# Altium footprint library Vowstar_Basic_Device.PcbLib: 170 footprints (part 5 of 11)
Each footprint in its own frame and in the unit in brackets; x right, y up, seen from the top. Pads: shape width x height; smd on the part's side, far side on the other; paste and mask are expansions set on the pad; w line width, h text height; cw(c..) or ccw(c..) is an arc to the next point about the centre after c.
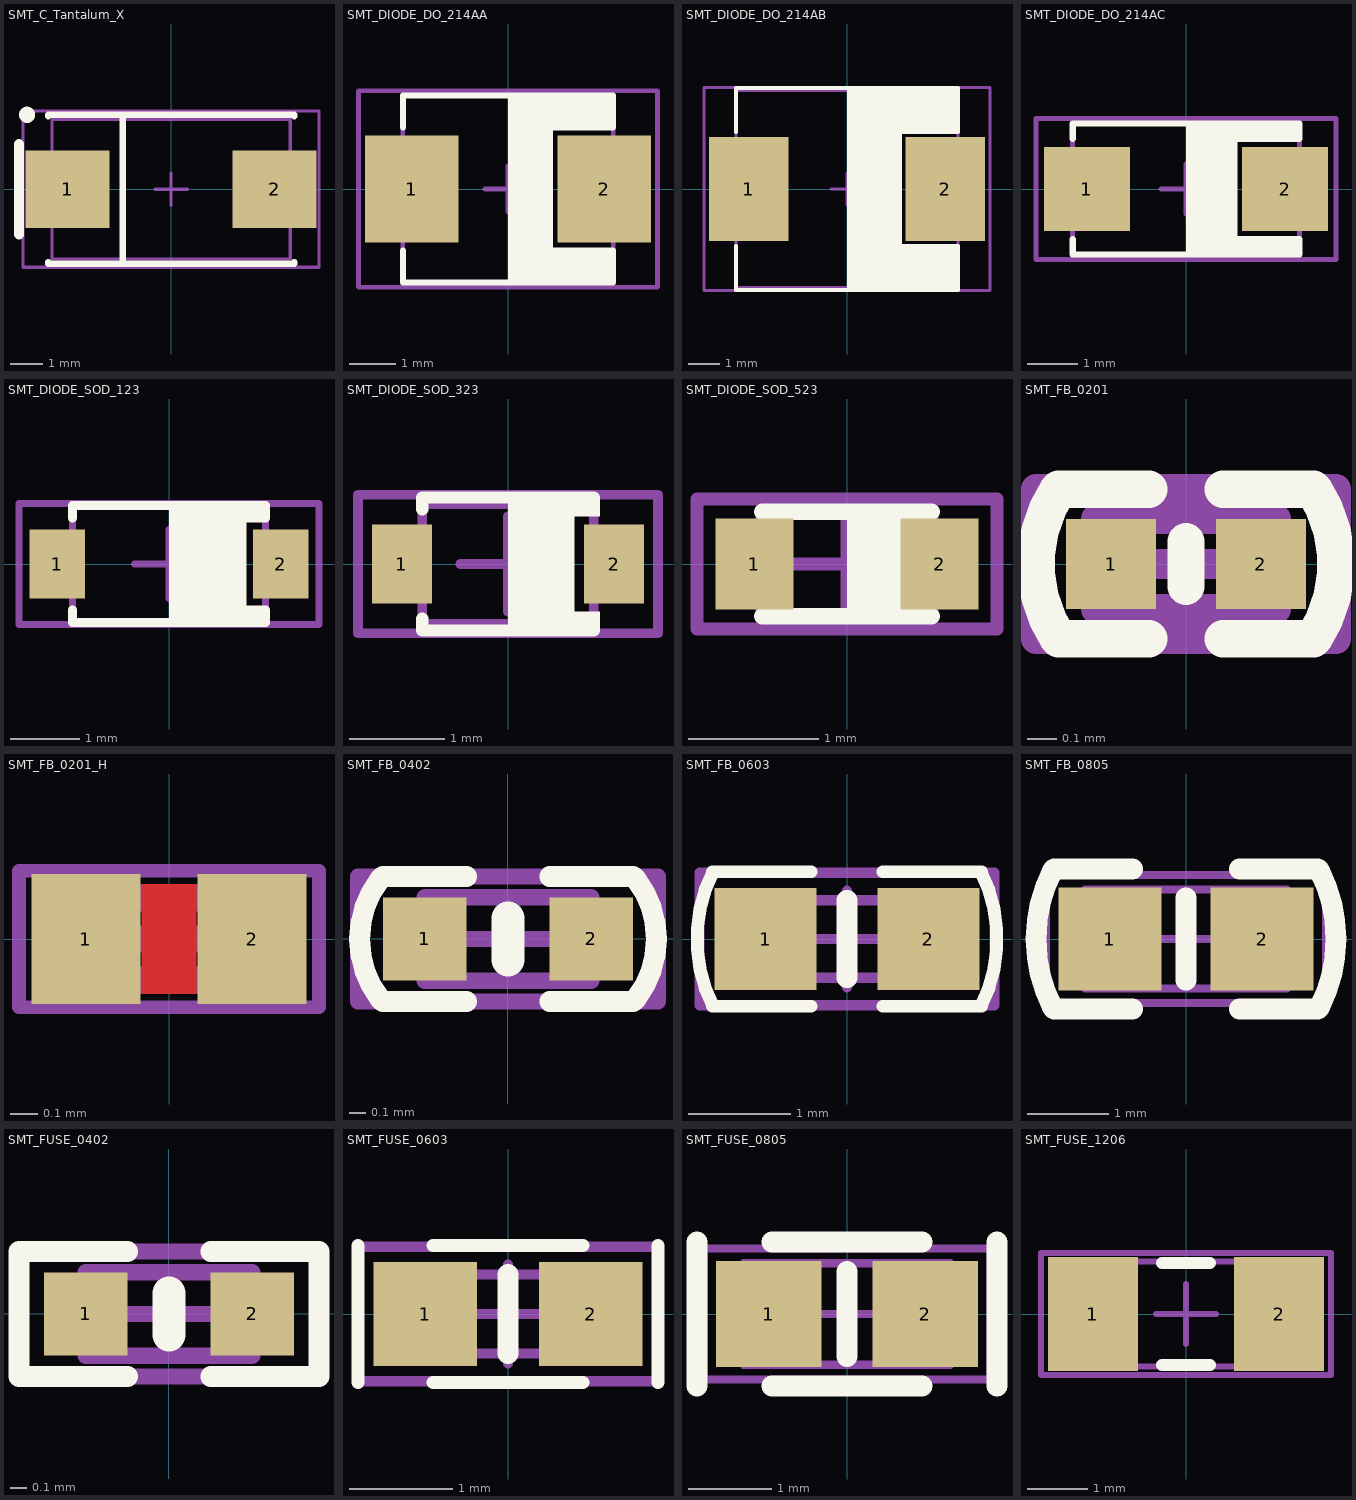
[diagram p4: the footprints below, top view; thin cyan lines are the x and y axes]

## SMT_C_Tantalum_X [mm] "Capacitor, SM Tantalum; Body 7.3 x 4.3 mm (LxW typ)"
height 4.3
pads (2):
  rect 2.6x2.4 smd: 1(-3.2,0) 2(3.2,0)
Top Overlay:
  circle w0.25: c-4.45,2.3 r0.125
  lines w0.2: -3.8,-2.25 -3.8,-2.3 3.8,-2.3 3.8,-2.25 ; -3.8,2.25 -3.8,2.3 3.8,2.3 3.8,2.25 ; -1.5,-2.3 -1.5,2.3
  lines w0.305: -4.699,-1.397 -4.699,1.397
Mechanical 13:
  lines w0.1: -3.683,-2.159 -3.683,2.159 3.683,2.159 3.683,-2.159 -3.683,-2.159
Mechanical 15:
  lines w0.1: -0.5,0 0.5,0 ; 0,-0.5 0,0.5 ; -4.572,-2.413 4.572,-2.413 4.572,2.413 -4.572,2.413 -4.572,-2.413
3D body "User Library-Cap-Tantalum-Case-X-7343-43.step": height 4, standoff 0, extent -3.658,-2.159 3.642,2.141

## SMT_DIODE_DO_214AA [mm] "DO-214AA(SMB) Package"
height 2.438
pads (2):
  rect 2x2.3 smd: 1(-2.06,0) 2(2.06,0)
Top Overlay:
  region: 0.963,2 0,2 0,-2 0.963,-2
  region: 2.25,-1.25 0,-1.25 0,-2 2.25,-2
  region: 2.25,2 0,2 0,1.25 2.25,1.25
  lines w0.127: -2.25,-1.312 -2.25,-2 2.25,-2 2.25,-1.312 ; -2.25,1.312 -2.25,2 2.25,2 2.25,1.312
Mechanical 13:
  lines w0.1: -2.25,-2 2.25,-2 2.25,2 -2.25,2 -2.25,-2
Mechanical 15:
  lines w0.1: -0.5,0 0.5,0 ; 0,-0.5 0,0.5 ; -3.2,-2.1 -3.2,2.1 3.2,2.1 3.2,-2.1 -3.2,-2.1
3D body "User Library-SMB(DO-214AA).step": height 2.45, standoff 0.03, extent -2.75,-1.95 2.75,1.95

## SMT_DIODE_DO_214AB [mm] "DO-214AB(SMC) Package"
height 2.616
pads (2):
  rect 2.5x3.27 smd: 1(-3.09,0) 2(3.09,0)
Top Overlay:
  region: 3.5,3.175 1.25,3.175 1.25,1.738 3.5,1.738
  region: 3.5,-1.737 1.25,-1.737 1.25,-3.175 3.5,-3.175
  region: 1.738,3.175 0,3.175 0,-3.175 1.738,-3.175
  lines w0.127: -3.5,-1.8 -3.5,-3.175 3.5,-3.175 3.5,-1.8 ; -3.5,1.8 -3.5,3.175 3.5,3.175 3.5,1.8
Mechanical 13:
  lines w0.1: -3.5,-3.1 -3.5,3.1 3.5,3.1 3.5,-3.1 -3.5,-3.1
Mechanical 15:
  lines w0.1: -0.5,0 0.5,0 ; 0,-0.5 0,0.5 ; -4.5,-3.2 4.5,-3.2 4.5,3.2 -4.5,3.2 -4.5,-3.2
3D body "User Library-Diode-DO-214AB(SMC).step": height 2.62, standoff -0.02, extent -4.064,-3.149 4.064,3.15

## SMT_DIODE_DO_214AC [mm] "DO-214AC(SMA) Package"
height 2.438
pads (2):
  rect 1.7x1.67 smd: 1(-1.965,0) 2(1.965,0)
Top Overlay:
  region: 0,1.3 0,-1.3 1.025,-1.3 1.025,1.3
  region: 2.25,1.3 0,1.3 0,0.936 2.25,0.936
  rectangle: 0,-1.3 2.25,-0.936
  lines w0.127: -2.25,-1 -2.25,-1.3 2.25,-1.3 2.25,-1 ; -2.25,1 -2.25,1.3 2.25,1.3 2.25,1
Mechanical 13:
  lines w0.1: -2.25,-1.3 2.25,-1.3 2.25,1.3 -2.25,1.3 -2.25,-1.3
Mechanical 15:
  lines w0.1: -0.5,0 0.5,0 ; 0,-0.5 0,0.5 ; -2.975,-1.4 2.975,-1.4 2.975,1.4 -2.975,1.4 -2.975,-1.4
3D body "User Library-DO-214AC SMA.step": height 2.35, standoff -0.05, extent -2.6,-1.3 2.6,1.3

## SMT_DIODE_SOD_123 [mm] "SOD-123(1206) Package"
height 1.25
pads (2):
  rect 0.8x1 smd: 1(-1.62,0) 2(1.62,0)
Top Overlay:
  region: 0,0.85 0,-0.85 1.125,-0.85 1.125,0.85
  rectangle: 0,0.6 1.425,0.8
  rectangle: 0,-0.8 1.425,-0.6
  lines w0.127: -1.4,-0.663 -1.4,-0.85 1.4,-0.85 1.4,-0.663 ; -1.4,0.663 -1.4,0.85 1.4,0.85 1.4,0.663
Mechanical 13:
  lines w0.1: -1.4,-0.85 -1.4,0.85 1.4,0.85 1.4,-0.85 -1.4,-0.85
Mechanical 15:
  lines w0.1: -0.5,0 0.5,0 ; 0,-0.5 0,0.5 ; -2.175,-0.875 -2.175,0.875 2.175,0.875 2.175,-0.875 -2.175,-0.875
3D body "User Library-SOD123.step": height 1.35, standoff 0, extent -1.85,-0.775 1.85,0.775

## SMT_DIODE_SOD_323 [mm] "SOD-323(0805) Package"
height 1.15
pads (2):
  rect 0.63x0.83 smd: 1(-1.115,0) 2(1.115,0)
Top Overlay:
  rectangle: 0,-0.7 0.7,0.7
  rectangle: 0.413,0.5 0.964,0.7
  rectangle: 0.413,-0.7 0.964,-0.5
  lines w0.127: -0.9,-0.575 -0.9,-0.7 0.9,-0.7 0.9,-0.575 ; -0.9,0.575 -0.9,0.7 0.9,0.7 0.9,0.575
Mechanical 13:
  lines w0.1: -0.9,-0.625 -0.9,0.625 0.9,0.625 0.9,-0.625 -0.9,-0.625
Mechanical 15:
  lines w0.1: -0.5,0 0.5,0 ; 0,-0.5 0,0.5 ; -1.575,-0.725 1.575,-0.725 1.575,0.725 -1.575,0.725 -1.575,-0.725
3D body "User Library-SOD323.step": height 1.1, standoff 0, extent -1.35,-0.625 1.35,0.625

## SMT_DIODE_SOD_523 [mm] "SOD-523(0603) Package"
height 0.77
pads (2):
  rect 0.6x0.7 smd: 1(-0.71,0) 2(0.71,0)
Top Overlay:
  rectangle: 0,-0.4 0.413,0.4
  lines w0.127: -0.65,-0.4 0.65,-0.4 ; -0.65,0.4 0.65,0.4
Mechanical 13:
  lines w0.1: -0.65,-0.4 0.65,-0.4 0.65,0.4 -0.65,0.4 -0.65,-0.4
Mechanical 15:
  lines w0.1: -0.475,0 0.475,0 ; 0,-0.475 0,0.475 ; -1.15,-0.5 1.15,-0.5 1.15,0.5 -1.15,0.5 -1.15,-0.5
3D body "User Library-SOD523.step": height 0.7, standoff 0, extent -0.8,-0.399 0.8,0.399

## SMT_FB_0201 [mil] "Surface mount ferrite beads 0201"
height 11.81
pads (2):
  rect 12x12 smd: 1(-10,0) 2(10,0)
Top Overlay:
  lines w5: -5,-10 -17,-10 cw(c-1.83,0) -17,10 -5,10 ; 0,-3 0,3 ; 5,-10 17,-10 ccw(c1.83,0) 17,10 5,10
Mechanical 13:
  lines w3.94: -12,-6 12,-6 12,6 -12,6 -12,-6
Mechanical 15:
  lines w3.94: -5,0 5,0 ; 0,-5 0,5 ; -20,-10 20,-10 20,10 -20,10 -20,-10
3D body "User Library-0201(0603M) Res.step": height 12.1, standoff 0, extent -11.99,-5.99 12.01,6.01

## SMT_FB_0201_H [mm] "Chip Ferrite beads, 2-Leads, Body 0.60x0.30mm, IPC High Density"
height 0.2
pads (2):
  rect 0.4x0.475 smd paste-1 mask-1: 1(-0.305,0) 2(0.305,0)
Top Layer:
  pour cut-out: -0.1,0.2 -0.1,-0.2 0.1,-0.2 0.1,0.2
Top Paste:
  region: 0.43,0.163 0.105,0.163 0.105,-0.162 0.43,-0.162
  rectangle: -0.43,-0.162 -0.105,0.162
Top Solder:
  rectangle: -0.43,-0.163 0.43,0.162
Mechanical 13:
  lines w0.1: -0.3,-0.15 -0.3,0.15 0.3,0.15 0.3,-0.15 -0.3,-0.15
Mechanical 15:
  lines w0.05: -0.55,-0.25 -0.55,0.25 0.55,0.25 0.55,-0.25 -0.55,-0.25
  lines w0.1: -0.15,0 0.15,0 ; 0,-0.15 0,0.15
3D body "User Library-0201(0603M) Res.step": height 0.31, standoff 0, extent -0.305,-0.152 0.305,0.153

## SMT_FB_0402 [mil] "Surface mount ferrite beads 0402"
height 11.81
pads (2):
  rect 20x20 smd: 1(-20,0) 2(20,0)
Top Overlay:
  lines w5: -30.54,-14.64 cw(c-12,0) -30.54,14.64 ; -30,-15 -10,-15 ; -30,15 -10,15 ; 10,-15 30,-15 ; 10,15 30,15 ; 30.54,-14.64 ccw(c12,0) 30.54,14.64
  lines w8: 0,-5 0,5
Mechanical 13:
  lines w3.94: -20,-10 20,-10 20,10 -20,10 -20,-10
Mechanical 15:
  lines w3.94: -10,0 10,0 ; 0,-10 0,10 ; -36,-15 36,-15 36,15 -36,15 -36,-15
3D body "User Library-0402(1005M) Res.step": height 20.1, standoff 0, extent -20,-10 20,10

## SMT_FB_0603 [mm] "Surface mount ferrite beads 0603"
height 0.85
pads (2):
  rect 1x1 smd: 1(-0.8,0) 2(0.8,0)
Top Overlay:
  lines w0.127: -1.321,-0.66 -0.356,-0.66 ; -1.321,0.66 -0.356,0.66 ; -1.318,-0.659 cw(c0,0) -1.318,0.659 ; 0.356,-0.66 1.321,-0.66 ; 0.356,0.66 1.321,0.66 ; 1.318,-0.659 ccw(c0,0) 1.318,0.659
  lines w0.203: 0,-0.381 0,0.381
Mechanical 13:
  lines w0.1: -1.016,-0.381 -1.016,0.381 1.016,0.381 1.016,-0.381 -1.016,-0.381
Mechanical 15:
  lines w0.1: -0.475,0 0.475,0 ; 0,-0.475 0,0.475 ; -1.448,-0.65 -1.448,0.65 1.448,0.65 1.448,-0.65 -1.448,-0.65
3D body "User Library-0603(1608M) Res.step": height 0.79, standoff 0, extent -1.016,-0.381 0.984,0.406

## SMT_FB_0805 [mil] "Surface mount ferrite beads 0805"
height 70
pads (2):
  rect 50x50 smd: 1(-37,0) 2(37,0)
Top Overlay:
  lines w10: -64.54,-33.76 cw(c0,0) -64.54,33.76 ; -64,-34 -26,-34 ; -64,34 -26,34 ; 0,-20 0,20 ; 26,-34 64,-34 ; 26,34 64,34 ; 64.54,-33.76 ccw(c0,0) 64.54,33.76
Mechanical 13:
  lines w3.94: -49,-24 49,-24 49,24 -49,24 -49,-24
Mechanical 15:
  lines w3.94: -19.68,0 19.69,0 ; 0,-19.69 0,19.68 ; -68,-31 -68,31 68,31 68,-31 -68,-31
3D body "User Library-0805(2012M) Res.step": height 31.1, standoff 0, extent -49.37,-24.5 49.38,24.5

## SMT_FUSE_0402 [mil] "Surface mount FUSE 0402"
height 11.81
pads (2):
  rect 20x20 smd: 1(-20,0) 2(20,0)
Top Overlay:
  lines w5: -10,-15 -36,-15 -36,15 -10,15 ; 10,-15 36,-15 36,15 10,15
  lines w8: 0,-5 0,5
Mechanical 13:
  lines w3.94: -20,-10 20,-10 20,10 -20,10 -20,-10
Mechanical 15:
  lines w3.94: -10,0 10,0 ; 0,-10 0,10 ; -36,-15 36,-15 36,15 -36,15 -36,-15
3D body "User Library-FUSE-0402.step": height 20.12, standoff -0.04, extent -19.68,-10.08 19.69,10.08

## SMT_FUSE_0603 [mm] "Surface mount FUSE 0603"
height 0.85
pads (2):
  rect 1x1 smd: 1(-0.8,0) 2(0.8,0)
Top Overlay:
  lines w0.127: -1.448,-0.66 -1.448,0.66 ; -0.724,-0.66 0.724,-0.66 ; -0.724,0.66 0.724,0.66 ; 1.448,-0.66 1.448,0.66
  lines w0.203: 0,-0.381 0,0.381
Mechanical 13:
  lines w0.1: -1.016,-0.381 1.016,-0.381 1.016,0.381 -1.016,0.381 -1.016,-0.381
Mechanical 15:
  lines w0.1: -0.475,0 0.475,0 ; 0,-0.475 0,0.475 ; -1.448,-0.65 1.448,-0.65 1.448,0.65 -1.448,0.65 -1.448,-0.65
3D body "User Library-FUSE-0603.step": height 0.8, standoff 0, extent -0.8,-0.401 0.8,0.401

## SMT_FUSE_0805 [mil] "Surface mount FUSE 0805"
height 70
pads (2):
  rect 50x50 smd: 1(-37,0) 2(37,0)
Top Overlay:
  lines w10: -71,-34 -71,34 ; -35.5,-34 35.5,-34 ; -35.5,34 35.5,34 ; 0,-20 0,20 ; 71,-34 71,34
Mechanical 13:
  lines w3.94: -49,-24 49,-24 49,24 -49,24 -49,-24
Mechanical 15:
  lines w3.94: -19.68,0 19.69,0 ; 0,-19.69 0,19.68 ; -68,-31 -68,31 68,31 68,-31 -68,-31
3D body "User Library-FUSE-0805.step": height 18.94, standoff 0, extent -39.36,-23.61 39.38,23.63

## SMT_FUSE_1206 [mm] "Surface mount FUSE 1206"
height 0.71
pads (2):
  rect 1.5x1.9 smd: 1(-1.55,0) 2(1.55,0)
Top Overlay:
  lines w0.2: -0.4,-0.85 0.4,-0.85 ; -0.4,0.85 0.4,0.85
Mechanical 13:
  lines w0.1: -1.675,-0.875 1.675,-0.875 1.675,0.875 -1.675,0.875 -1.675,-0.875
Mechanical 15:
  lines w0.1: -0.5,0 0.5,0 ; 0,-0.5 0,0.5 ; -2.413,-1.016 2.413,-1.016 2.413,1.016 -2.413,1.016 -2.413,-1.016
3D body "User Library-FUSE-1206.step": height 0.56, standoff 0, extent -1.601,-0.826 1.601,0.826